# Altium footprint library 15-LEDs+LCD.PcbLib: 116 footprints (part 5 of 8) (continued)
## LED_DIALIGHT_570-0100-222F [mm] "3x Green LED 2mm PCB Edge Mounting DIALIGHT 570 Serie" (continued)
  text "A" at 3.96,-1.79 h1
  text "C" at 3.96,0.705 h1
  text "1" at -4.243,-1.53 h1
  text "2" at -4.458,0.79 h1
3D body "LED_DIALIGHT_570-0100-222F.stp": height 10.41, standoff -3.2, extent -11.12,-2.485 3.5,2.917

## LED_DIALIGHT_570-0100-223F [mm] "3x 2mm LED (Top: Green , Middle: Green, Bot: Yellow) PCB Edge Mounting DIALIGHT 570 Serie"
height 10.41
pads (6):
  round 1.7 hole 1: 1(-2.54,-1.27) 2(-2.54,1.27) 3(0,-1.27) 4(0,1.27) 5(2.54,-1.27) 6(2.54,1.27)
Top Overlay:
  lines w0.2: -9.59,-0.9 -10.22,-0.9 cw(c-10.22,0) -10.22,0.9 -9.59,0.9 ; -9.39,-1.651 -9.59,-1.651 -9.59,1.651 -9.39,1.651 ; -9.39,2.485 -9.39,-2.485 -3.086,-2.485 -3.086,-2.167 ; -3.086,2.493 -9.39,2.493 3.5,2.493 ; -3.048,2.493 -3.048,2.789 ; -2.032,2.493 -2.032,2.789 ; -1.994,-2.167 -1.994,-2.485 3.5,-2.485 3.5,-1.903 ; -1.994,2.493 3.5,2.493 ; 3.5,-0.637 3.5,0.637 ; 3.5,1.903 3.5,2.493
  text "A" at 3.96,-1.79 h1
  text "C" at 3.96,0.705 h1
  text "1" at -4.243,-1.53 h1
  text "2" at -4.458,0.79 h1
Mechanical 8:
  lines w0.1: -3.04,-1.27 -2.54,-1.27 ; -3.04,-1.27 -2.54,-1.27 ; -3.04,-1.27 -2.54,-1.27 ; -3.04,1.27 -2.54,1.27 ; -3.04,1.27 -2.54,1.27 ; -3.04,1.27 -2.54,1.27 ; -2.54,-1.77 -2.54,-1.27 ; -2.54,-1.77 -2.54,-1.27 ; -2.54,-1.77 -2.54,-1.27 ; -2.54,-1.27 -2.54,-0.77 ; -2.54,-1.27 -2.04,-1.27 ; -2.54,-1.27 -2.54,-0.77 ; -2.54,-1.27 -2.04,-1.27 ; -2.54,-1.27 -2.54,-0.77 ; -2.54,-1.27 -2.04,-1.27 ; -2.54,0.77 -2.54,1.27 ; -2.54,0.77 -2.54,1.27 ; -2.54,0.77 -2.54,1.27 ; -2.54,1.27 -2.54,1.77 ; -2.54,1.27 -2.04,1.27 ; -2.54,1.27 -2.54,1.77 ; -2.54,1.27 -2.04,1.27 ; -2.54,1.27 -2.54,1.77 ; -2.54,1.27 -2.04,1.27 ; -0.5,-1.27 0,-1.27 ; -0.5,-1.27 0,-1.27 ; -0.5,-1.27 0,-1.27 ; -0.5,0 0,0 ; -0.5,0 0,0 ; -0.5,0 0,0 ; -0.5,1.27 0,1.27 ; -0.5,1.27 0,1.27 ; -0.5,1.27 0,1.27 ; 0,-1.77 0,-1.27 ; 0,-1.77 0,-1.27 ; 0,-1.77 0,-1.27 ; 0,-1.27 0,-0.77 ; 0,-1.27 0.5,-1.27 ; 0,-1.27 0,-0.77 ; 0,-1.27 0.5,-1.27 ; 0,-1.27 0,-0.77 ; 0,-1.27 0.5,-1.27 ; 0,-0.5 0,0 ; 0,-0.5 0,0 ; 0,-0.5 0,0 ; 0,0 0,0.5 ; 0,0 0.5,0 ; 0,0 0,0.5 ; 0,0 0.5,0 ; 0,0 0,0.5 ; 0,0 0.5,0 ; 0,0.77 0,1.27 ; 0,0.77 0,1.27 ; 0,0.77 0,1.27 ; 0,1.27 0,1.77 ; 0,1.27 0.5,1.27 ; 0,1.27 0,1.77 ; 0,1.27 0.5,1.27 ; 0,1.27 0,1.77 ; 0,1.27 0.5,1.27 ; 2.04,-1.27 2.54,-1.27 ; 2.04,-1.27 2.54,-1.27 ; 2.04,-1.27 2.54,-1.27 ; 2.04,1.27 2.54,1.27 ; 2.04,1.27 2.54,1.27 ; 2.04,1.27 2.54,1.27 ; 2.54,-1.77 2.54,-1.27 ; 2.54,-1.77 2.54,-1.27 ; 2.54,-1.77 2.54,-1.27 ; 2.54,-1.27 2.54,-0.77 ; 2.54,-1.27 3.04,-1.27 ; 2.54,-1.27 2.54,-0.77 ; 2.54,-1.27 3.04,-1.27 ; 2.54,-1.27 2.54,-0.77 ; 2.54,-1.27 3.04,-1.27 ; 2.54,0.77 2.54,1.27 ; 2.54,0.77 2.54,1.27 ; 2.54,0.77 2.54,1.27 ; 2.54,1.27 2.54,1.77 ; 2.54,1.27 3.04,1.27 ; 2.54,1.27 2.54,1.77 ; 2.54,1.27 3.04,1.27 ; 2.54,1.27 2.54,1.77 ; 2.54,1.27 3.04,1.27
Mechanical 14:
  lines w0.1: -3.048,2.485 -3.048,2.917 ; -2.032,2.485 -2.032,2.917 ; -10.22,-0.9 cw(c-10.22,0) -10.22,0.9 ; -10.22,-0.9 cw(c-10.22,0) -10.22,0.9 ; -10.22,-0.9 cw(c-10.22,0) -10.22,0.9 ; -10.22,-0.9 -9.59,-0.9 ; -10.22,-0.9 -9.59,-0.9 ; -10.22,-0.9 -9.59,-0.9 ; -10.22,0.9 -9.59,0.9 ; -10.22,0.9 -9.59,0.9 ; -10.22,0.9 -9.59,0.9 ; -9.59,-1.651 -9.59,1.651 ; -9.59,-1.651 -9.39,-1.651 ; -9.59,-1.651 -9.59,1.651 ; -9.59,-1.651 -9.39,-1.651 ; -9.59,-1.651 -9.59,1.651 ; -9.59,-1.651 -9.39,-1.651 ; -9.59,1.651 -9.39,1.651 ; -9.59,1.651 -9.39,1.651 ; -9.59,1.651 -9.39,1.651 ; -9.39,-2.485 -9.39,2.485 ; -9.39,-2.485 -3.086,-2.485 ; -9.39,-2.485 -9.39,2.485 ; -9.39,-2.485 -3.086,-2.485 ; -9.39,-2.485 -9.39,2.485 ; -9.39,-2.485 -3.086,-2.485 ; -9.39,2.493 -3.048,2.493 ; -9.39,2.493 -3.048,2.493 ; -9.39,2.493 3.5,2.493 ; -3.086,-2.485 -3.086,-1.977 ; -3.086,-2.485 -3.086,-1.977 ; -3.086,-2.485 -3.086,-1.977 ; -3.086,-1.977 -1.994,-1.977 ; -3.086,-1.977 -1.994,-1.977 ; -3.086,-1.977 -1.994,-1.977 ; -3.048,2.493 -3.048,2.917 ; -3.048,2.493 -3.048,2.917 ; -3.048,2.917 -2.032,2.917 ; -3.048,2.917 -2.032,2.917 ; -3.048,2.917 -2.032,2.917 ; -2.032,2.493 -2.032,2.917 ; -2.032,2.493 3.5,2.493 ; -2.032,2.493 -2.032,2.917 ; -1.994,-2.485 -1.994,-1.977 ; -1.994,-2.485 3.5,-2.485 ; -1.994,-2.485 -1.994,-1.977 ; -1.994,-2.485 3.5,-2.485 ; -1.994,-2.485 -1.994,-1.977 ; -1.994,-2.485 3.5,-2.485 ; 3.5,-2.485 3.5,2.493 ; 3.5,-2.485 3.5,2.493 ; 3.5,-2.485 3.5,2.493
  text "A" at 3.96,-1.79 h1
  text "C" at 3.96,0.705 h1
  text "1" at -4.243,-1.53 h1
  text "2" at -4.458,0.79 h1
3D body "LED_DIALIGHT_570-0100-223F.stp": height 10.41, standoff -3.2, extent -11.12,-2.485 3.5,2.917

## LED_DIALIGHT_570-0100-330F [mm] "3x 2mm LED (Top: Green , Middle: Green, Bot: Blank) PCB Edge Mounting DIALIGHT 570 Serie"
height 10.41
pads (6):
  round 1.7 hole 1: 1(-2.54,-1.27) 2(-2.54,1.27) 3(0,-1.27) 4(0,1.27) 5(2.54,-1.27) 6(2.54,1.27)
Top Overlay:
  lines w0.2: -9.59,-0.9 -10.22,-0.9 cw(c-10.22,0) -10.22,0.9 -9.59,0.9 ; -9.39,-1.651 -9.59,-1.651 -9.59,1.651 -9.39,1.651 ; -9.39,2.485 -9.39,-2.485 -3.086,-2.485 -3.086,-2.167 ; -3.086,2.493 -9.39,2.493 3.5,2.493 ; -3.048,2.493 -3.048,2.789 ; -2.032,2.493 -2.032,2.789 ; -1.994,-2.167 -1.994,-2.485 3.5,-2.485 3.5,-1.903 ; -1.994,2.493 3.5,2.493 ; 3.5,-0.637 3.5,0.637 ; 3.5,1.903 3.5,2.493
  text "A" at 3.96,-1.79 h1
  text "C" at 3.96,0.705 h1
  text "1" at -4.243,-1.53 h1
  text "2" at -4.458,0.79 h1
Mechanical 8:
  lines w0.1: -3.04,-1.27 -2.54,-1.27 ; -3.04,-1.27 -2.54,-1.27 ; -3.04,-1.27 -2.54,-1.27 ; -3.04,1.27 -2.54,1.27 ; -3.04,1.27 -2.54,1.27 ; -3.04,1.27 -2.54,1.27 ; -2.54,-1.77 -2.54,-1.27 ; -2.54,-1.77 -2.54,-1.27 ; -2.54,-1.77 -2.54,-1.27 ; -2.54,-1.27 -2.54,-0.77 ; -2.54,-1.27 -2.04,-1.27 ; -2.54,-1.27 -2.54,-0.77 ; -2.54,-1.27 -2.04,-1.27 ; -2.54,-1.27 -2.54,-0.77 ; -2.54,-1.27 -2.04,-1.27 ; -2.54,0.77 -2.54,1.27 ; -2.54,0.77 -2.54,1.27 ; -2.54,0.77 -2.54,1.27 ; -2.54,1.27 -2.54,1.77 ; -2.54,1.27 -2.04,1.27 ; -2.54,1.27 -2.54,1.77 ; -2.54,1.27 -2.04,1.27 ; -2.54,1.27 -2.54,1.77 ; -2.54,1.27 -2.04,1.27 ; -0.5,-1.27 0,-1.27 ; -0.5,-1.27 0,-1.27 ; -0.5,-1.27 0,-1.27 ; -0.5,0 0,0 ; -0.5,0 0,0 ; -0.5,0 0,0 ; -0.5,1.27 0,1.27 ; -0.5,1.27 0,1.27 ; -0.5,1.27 0,1.27 ; 0,-1.77 0,-1.27 ; 0,-1.77 0,-1.27 ; 0,-1.77 0,-1.27 ; 0,-1.27 0,-0.77 ; 0,-1.27 0.5,-1.27 ; 0,-1.27 0,-0.77 ; 0,-1.27 0.5,-1.27 ; 0,-1.27 0,-0.77 ; 0,-1.27 0.5,-1.27 ; 0,-0.5 0,0 ; 0,-0.5 0,0 ; 0,-0.5 0,0 ; 0,0 0,0.5 ; 0,0 0.5,0 ; 0,0 0,0.5 ; 0,0 0.5,0 ; 0,0 0,0.5 ; 0,0 0.5,0 ; 0,0.77 0,1.27 ; 0,0.77 0,1.27 ; 0,0.77 0,1.27 ; 0,1.27 0,1.77 ; 0,1.27 0.5,1.27 ; 0,1.27 0,1.77 ; 0,1.27 0.5,1.27 ; 0,1.27 0,1.77 ; 0,1.27 0.5,1.27 ; 2.04,-1.27 2.54,-1.27 ; 2.04,-1.27 2.54,-1.27 ; 2.04,-1.27 2.54,-1.27 ; 2.04,1.27 2.54,1.27 ; 2.04,1.27 2.54,1.27 ; 2.04,1.27 2.54,1.27 ; 2.54,-1.77 2.54,-1.27 ; 2.54,-1.77 2.54,-1.27 ; 2.54,-1.77 2.54,-1.27 ; 2.54,-1.27 2.54,-0.77 ; 2.54,-1.27 3.04,-1.27 ; 2.54,-1.27 2.54,-0.77 ; 2.54,-1.27 3.04,-1.27 ; 2.54,-1.27 2.54,-0.77 ; 2.54,-1.27 3.04,-1.27 ; 2.54,0.77 2.54,1.27 ; 2.54,0.77 2.54,1.27 ; 2.54,0.77 2.54,1.27 ; 2.54,1.27 2.54,1.77 ; 2.54,1.27 3.04,1.27 ; 2.54,1.27 2.54,1.77 ; 2.54,1.27 3.04,1.27 ; 2.54,1.27 2.54,1.77 ; 2.54,1.27 3.04,1.27
Mechanical 14:
  lines w0.1: -3.048,2.485 -3.048,2.917 ; -2.032,2.485 -2.032,2.917 ; -10.22,-0.9 cw(c-10.22,0) -10.22,0.9 ; -10.22,-0.9 cw(c-10.22,0) -10.22,0.9 ; -10.22,-0.9 cw(c-10.22,0) -10.22,0.9 ; -10.22,-0.9 -9.59,-0.9 ; -10.22,-0.9 -9.59,-0.9 ; -10.22,-0.9 -9.59,-0.9 ; -10.22,0.9 -9.59,0.9 ; -10.22,0.9 -9.59,0.9 ; -10.22,0.9 -9.59,0.9 ; -9.59,-1.651 -9.59,1.651 ; -9.59,-1.651 -9.39,-1.651 ; -9.59,-1.651 -9.59,1.651 ; -9.59,-1.651 -9.39,-1.651 ; -9.59,-1.651 -9.59,1.651 ; -9.59,-1.651 -9.39,-1.651 ; -9.59,1.651 -9.39,1.651 ; -9.59,1.651 -9.39,1.651 ; -9.59,1.651 -9.39,1.651 ; -9.39,-2.485 -9.39,2.485 ; -9.39,-2.485 -3.086,-2.485 ; -9.39,-2.485 -9.39,2.485 ; -9.39,-2.485 -3.086,-2.485 ; -9.39,-2.485 -9.39,2.485 ; -9.39,-2.485 -3.086,-2.485 ; -9.39,2.493 -3.048,2.493 ; -9.39,2.493 -3.048,2.493 ; -9.39,2.493 3.5,2.493 ; -3.086,-2.485 -3.086,-1.977 ; -3.086,-2.485 -3.086,-1.977 ; -3.086,-2.485 -3.086,-1.977 ; -3.086,-1.977 -1.994,-1.977 ; -3.086,-1.977 -1.994,-1.977 ; -3.086,-1.977 -1.994,-1.977 ; -3.048,2.493 -3.048,2.917 ; -3.048,2.493 -3.048,2.917 ; -3.048,2.917 -2.032,2.917 ; -3.048,2.917 -2.032,2.917 ; -3.048,2.917 -2.032,2.917 ; -2.032,2.493 -2.032,2.917 ; -2.032,2.493 3.5,2.493 ; -2.032,2.493 -2.032,2.917 ; -1.994,-2.485 -1.994,-1.977 ; -1.994,-2.485 3.5,-2.485 ; -1.994,-2.485 -1.994,-1.977 ; -1.994,-2.485 3.5,-2.485 ; -1.994,-2.485 -1.994,-1.977 ; -1.994,-2.485 3.5,-2.485 ; 3.5,-2.485 3.5,2.493 ; 3.5,-2.485 3.5,2.493 ; 3.5,-2.485 3.5,2.493
  text "A" at 3.96,-1.79 h1
  text "C" at 3.96,0.705 h1
  text "1" at -4.243,-1.53 h1
  text "2" at -4.458,0.79 h1
3D body "LED_DIALIGHT_570-0100-330F.stp": height 10.41, standoff -3.2, extent -11.12,-2.485 3.5,2.917

## LED_DIALIGHT_570-0100-333F [mm] "3x Yellow LED 2mm PCB Edge Mounting DIALIGHT 570 Serie"
height 10.41
pads (6):
  round 1.7 hole 1: 1(-2.54,-1.27) 2(-2.54,1.27) 3(0,-1.27) 4(0,1.27) 5(2.54,-1.27) 6(2.54,1.27)
Top Overlay:
  lines w0.2: -9.59,-0.9 -10.22,-0.9 cw(c-10.22,0) -10.22,0.9 -9.59,0.9 ; -9.39,-1.651 -9.59,-1.651 -9.59,1.651 -9.39,1.651 ; -9.39,2.485 -9.39,-2.485 -3.086,-2.485 -3.086,-2.167 ; -3.086,2.493 -9.39,2.493 3.5,2.493 ; -3.048,2.493 -3.048,2.789 ; -2.032,2.493 -2.032,2.789 ; -1.994,-2.167 -1.994,-2.485 3.5,-2.485 3.5,-1.903 ; -1.994,2.493 3.5,2.493 ; 3.5,-0.637 3.5,0.637 ; 3.5,1.903 3.5,2.493
  text "2" at -4.458,0.79 h1
  text "1" at -4.243,-1.53 h1
  text "C" at 3.96,0.705 h1
  text "A" at 3.96,-1.79 h1
Mechanical 8:
  lines w0.1: -3.04,-1.27 -2.54,-1.27 ; -3.04,-1.27 -2.54,-1.27 ; -3.04,-1.27 -2.54,-1.27 ; -3.04,1.27 -2.54,1.27 ; -3.04,1.27 -2.54,1.27 ; -3.04,1.27 -2.54,1.27 ; -2.54,-1.77 -2.54,-1.27 ; -2.54,-1.77 -2.54,-1.27 ; -2.54,-1.77 -2.54,-1.27 ; -2.54,-1.27 -2.04,-1.27 ; -2.54,-1.27 -2.54,-0.77 ; -2.54,-1.27 -2.04,-1.27 ; -2.54,-1.27 -2.54,-0.77 ; -2.54,-1.27 -2.04,-1.27 ; -2.54,-1.27 -2.54,-0.77 ; -2.54,0.77 -2.54,1.27 ; -2.54,0.77 -2.54,1.27 ; -2.54,0.77 -2.54,1.27 ; -2.54,1.27 -2.04,1.27 ; -2.54,1.27 -2.54,1.77 ; -2.54,1.27 -2.04,1.27 ; -2.54,1.27 -2.54,1.77 ; -2.54,1.27 -2.04,1.27 ; -2.54,1.27 -2.54,1.77 ; -0.5,-1.27 0,-1.27 ; -0.5,-1.27 0,-1.27 ; -0.5,-1.27 0,-1.27 ; -0.5,0 0,0 ; -0.5,0 0,0 ; -0.5,0 0,0 ; -0.5,1.27 0,1.27 ; -0.5,1.27 0,1.27 ; -0.5,1.27 0,1.27 ; 0,-1.77 0,-1.27 ; 0,-1.77 0,-1.27 ; 0,-1.77 0,-1.27 ; 0,-1.27 0.5,-1.27 ; 0,-1.27 0,-0.77 ; 0,-1.27 0.5,-1.27 ; 0,-1.27 0,-0.77 ; 0,-1.27 0.5,-1.27 ; 0,-1.27 0,-0.77 ; 0,-0.5 0,0 ; 0,-0.5 0,0 ; 0,-0.5 0,0 ; 0,0 0.5,0 ; 0,0 0,0.5 ; 0,0 0.5,0 ; 0,0 0,0.5 ; 0,0 0.5,0 ; 0,0 0,0.5 ; 0,0.77 0,1.27 ; 0,0.77 0,1.27 ; 0,0.77 0,1.27 ; 0,1.27 0.5,1.27 ; 0,1.27 0,1.77 ; 0,1.27 0.5,1.27 ; 0,1.27 0,1.77 ; 0,1.27 0.5,1.27 ; 0,1.27 0,1.77 ; 2.04,-1.27 2.54,-1.27 ; 2.04,-1.27 2.54,-1.27 ; 2.04,-1.27 2.54,-1.27 ; 2.04,1.27 2.54,1.27 ; 2.04,1.27 2.54,1.27 ; 2.04,1.27 2.54,1.27 ; 2.54,-1.77 2.54,-1.27 ; 2.54,-1.77 2.54,-1.27 ; 2.54,-1.77 2.54,-1.27 ; 2.54,-1.27 3.04,-1.27 ; 2.54,-1.27 2.54,-0.77 ; 2.54,-1.27 3.04,-1.27 ; 2.54,-1.27 2.54,-0.77 ; 2.54,-1.27 3.04,-1.27 ; 2.54,-1.27 2.54,-0.77 ; 2.54,0.77 2.54,1.27 ; 2.54,0.77 2.54,1.27 ; 2.54,0.77 2.54,1.27 ; 2.54,1.27 3.04,1.27 ; 2.54,1.27 2.54,1.77 ; 2.54,1.27 3.04,1.27 ; 2.54,1.27 2.54,1.77 ; 2.54,1.27 3.04,1.27 ; 2.54,1.27 2.54,1.77
Mechanical 14:
  lines w0.1: -3.048,2.485 -3.048,2.917 ; -2.032,2.485 -2.032,2.917 ; -10.22,-0.9 cw(c-10.22,0) -10.22,0.9 ; -10.22,-0.9 cw(c-10.22,0) -10.22,0.9 ; -10.22,-0.9 cw(c-10.22,0) -10.22,0.9 ; -10.22,-0.9 -9.59,-0.9 ; -10.22,-0.9 -9.59,-0.9 ; -10.22,-0.9 -9.59,-0.9 ; -10.22,0.9 -9.59,0.9 ; -10.22,0.9 -9.59,0.9 ; -10.22,0.9 -9.59,0.9 ; -9.59,-1.651 -9.39,-1.651 ; -9.59,-1.651 -9.59,1.651 ; -9.59,-1.651 -9.39,-1.651 ; -9.59,-1.651 -9.59,1.651 ; -9.59,-1.651 -9.39,-1.651 ; -9.59,-1.651 -9.59,1.651 ; -9.59,1.651 -9.39,1.651 ; -9.59,1.651 -9.39,1.651 ; -9.59,1.651 -9.39,1.651 ; -9.39,-2.485 -3.086,-2.485 ; -9.39,-2.485 -9.39,2.485 ; -9.39,-2.485 -3.086,-2.485 ; -9.39,-2.485 -9.39,2.485 ; -9.39,-2.485 -3.086,-2.485 ; -9.39,-2.485 -9.39,2.485 ; -9.39,2.493 3.5,2.493 ; -9.39,2.493 -3.048,2.493 ; -9.39,2.493 -3.048,2.493 ; -3.086,-2.485 -3.086,-1.977 ; -3.086,-2.485 -3.086,-1.977 ; -3.086,-2.485 -3.086,-1.977 ; -3.086,-1.977 -1.994,-1.977 ; -3.086,-1.977 -1.994,-1.977 ; -3.086,-1.977 -1.994,-1.977 ; -3.048,2.493 -3.048,2.917 ; -3.048,2.493 -3.048,2.917 ; -3.048,2.917 -2.032,2.917 ; -3.048,2.917 -2.032,2.917 ; -3.048,2.917 -2.032,2.917 ; -2.032,2.493 -2.032,2.917 ; -2.032,2.493 3.5,2.493 ; -2.032,2.493 -2.032,2.917 ; -1.994,-2.485 3.5,-2.485 ; -1.994,-2.485 -1.994,-1.977 ; -1.994,-2.485 3.5,-2.485 ; -1.994,-2.485 -1.994,-1.977 ; -1.994,-2.485 3.5,-2.485 ; -1.994,-2.485 -1.994,-1.977 ; 3.5,-2.485 3.5,2.493 ; 3.5,-2.485 3.5,2.493 ; 3.5,-2.485 3.5,2.493
  text "2" at -4.458,0.79 h1
  text "1" at -4.243,-1.53 h1
  text "C" at 3.96,0.705 h1
  text "A" at 3.96,-1.79 h1
3D body "LED_DIALIGHT_570-0100-333F.stp": height 10.41, standoff -3.2, extent -11.12,-2.485 3.5,2.917

## LED_DIALIGHT_571-0111-100F [mm] "2x 2mm LED (Top: Red, Bot: Red) PCB Edge Mounting (With positioning pins) DIALIGHT 571 Serie"
height 8.6
pads (4):
  round 1.7 hole 1: 1(0,0) 2(2.54,0) 3(5.08,0) 4(7.62,0)
Top Overlay:
  lines w0.2: -4.83,-1 -5.35,-1 cw(c-5.35,0) -5.35,1 -4.83,1 ; -4.445,0 -4.064,0 ; -4.064,-0.508 -4.064,0.508 ; -3.556,0 -3.175,0 ; -3.46,-1.25 -4.83,-1.25 ; -3.46,1.25 -4.83,1.25 ; -2.794,0 -2.413,0 ; -2.413,-0.508 -2.413,0.508 ; -1.905,0 -1.524,0 ; -1.67,-1.8 -1.67,-1.25 ; -0.87,-1.8 -0.87,-1.25 ; 3.41,-1.8 3.41,-1.25 ; 4.21,-1.8 4.21,-1.25 ; -4.83,-1.25 -4.83,1.25 ; -4.83,-1.25 8.89,-1.25 8.89,1.25 -4.83,1.25 ; -4.064,0 -3.556,0.508 -3.556,-0.508 -4.064,0 ; -2.413,0 -1.905,0.508 -1.905,-0.508 -2.413,0 ; -1.37,-2.52 -1.17,-2.52 -1.37,-2.52 ; 3.71,-2.52 3.91,-2.52 3.71,-2.52
Mechanical 8:
  lines w0.1: -1,0 0,0 ; 0,-1 0,0 ; 0,1 0,0 ; 1,0 0,0 ; 1.54,0 2.54,0 ; 2.54,-1 2.54,0 ; 2.54,1 2.54,0 ; 3.54,0 2.54,0 ; 4.08,0 5.08,0 ; 5.08,-1 5.08,0 ; 5.08,1 5.08,0 ; 6.08,0 5.08,0 ; 6.62,0 7.62,0 ; 7.62,-1 7.62,0 ; 7.62,1 7.62,0 ; 8.62,0 7.62,0
Mechanical 14:
  lines w0.1: -4.83,-1 -5.35,-1 cw(c-5.35,0) -5.35,1 -4.83,1 ; -4.445,0 -4.064,0 ; -3.556,0 -3.175,0 ; -3.46,-1.25 -4.83,-1.25 ; -3.46,1.25 -4.83,1.25 ; -2.794,0 -2.413,0 ; -1.905,0 -1.524,0 ; -1.67,-1.25 -1.67,-2.22 ccw(c-1.37,-2.22) -1.37,-2.52 -1.17,-2.52 ccw(c-1.17,-2.22) -0.87,-2.22 -0.87,-1.25 ; 3.41,-1.25 3.41,-2.22 ccw(c3.71,-2.22) 3.71,-2.52 3.91,-2.52 ccw(c3.91,-2.22) 4.21,-2.22 4.21,-1.25 ; -4.83,-1.25 -4.83,1.25 ; -4.83,-1.25 8.89,-1.25 8.89,1.25 -4.83,1.25 ; -4.064,-0.508 -4.064,0.508 ; -4.064,-0.508 -4.064,0.508 ; -4.064,-0.508 -4.064,0.508 ; -4.064,0 -3.556,-0.508 ; -4.064,0 -3.556,0.508 ; -4.064,0 -3.556,0.508 ; -4.064,0 -3.556,-0.508 ; -4.064,0 -3.556,-0.508 ; -4.064,0 -3.556,0.508 ; -3.556,-0.508 -3.556,0.508 ; -3.556,-0.508 -3.556,0.508 ; -3.556,-0.508 -3.556,0.508 ; -2.413,-0.508 -2.413,0.508 ; -2.413,-0.508 -2.413,0.508 ; -2.413,-0.508 -2.413,0.508 ; -2.413,0 -1.905,-0.508 ; -2.413,0 -1.905,0.508 ; -2.413,0 -1.905,0.508 ; -2.413,0 -1.905,-0.508 ; -2.413,0 -1.905,-0.508 ; -2.413,0 -1.905,0.508 ; -1.905,-0.508 -1.905,0.508 ; -1.905,-0.508 -1.905,0.508 ; -1.905,-0.508 -1.905,0.508
3D body "LED_DIALIGHT_571-0111-100F.stp": height 8.6, standoff -3, extent -6.35,-2.52 8.89,1.25

## LED_DIALIGHT_571-0111F [mm] "2x 2mm LED (Top: Red, Bot: Red) PCB Edge Mounting (Without positioning pins) DIALIGHT 571 Serie"
height 8.6
pads (4):
  round 1.7 hole 1: 1(0,0) 2(2.54,0) 3(5.08,0) 4(7.62,0)
Top Overlay:
  lines w0.2: -4.83,-1 -5.35,-1 cw(c-5.35,0) -5.35,1 -4.83,1 ; -4.445,0 -4.064,0 ; -4.064,-0.508 -4.064,0.508 ; -3.556,0 -3.175,0 ; -3.46,-1.25 -4.83,-1.25 ; -3.46,1.25 -4.83,1.25 ; -2.794,0 -2.413,0 ; -2.413,-0.508 -2.413,0.508 ; -1.905,0 -1.524,0 ; -4.83,-1.25 8.89,-1.25 8.89,1.25 -4.83,1.25 ; -4.83,-1.25 -4.83,1.25 ; -4.064,0 -3.556,-0.508 -3.556,0.508 -4.064,0 ; -2.413,0 -1.905,-0.508 -1.905,0.508 -2.413,0
Mechanical 8:
  lines w0.1: -1,0 0,0 ; 0,-1 0,0 ; 0,1 0,0 ; 1,0 0,0 ; 1.54,0 2.54,0 ; 2.54,-1 2.54,0 ; 2.54,1 2.54,0 ; 3.54,0 2.54,0 ; 4.08,0 5.08,0 ; 5.08,-1 5.08,0 ; 5.08,1 5.08,0 ; 6.08,0 5.08,0 ; 6.62,0 7.62,0 ; 7.62,-1 7.62,0 ; 7.62,1 7.62,0 ; 8.62,0 7.62,0
Mechanical 14:
  lines w0.1: -4.83,-1 -5.35,-1 cw(c-5.35,0) -5.35,1 -4.83,1 ; -4.445,0 -4.064,0 ; -3.556,0 -3.175,0 ; -3.46,-1.25 -4.83,-1.25 ; -3.46,1.25 -4.83,1.25 ; -2.794,0 -2.413,0 ; -1.905,0 -1.524,0 ; -4.83,-1.25 8.89,-1.25 8.89,1.25 -4.83,1.25 ; -4.83,-1.25 -4.83,1.25 ; -4.064,-0.508 -4.064,0.508 ; -4.064,-0.508 -4.064,0.508 ; -4.064,-0.508 -4.064,0.508 ; -4.064,0 -3.556,0.508 ; -4.064,0 -3.556,-0.508 ; -4.064,0 -3.556,-0.508 ; -4.064,0 -3.556,0.508 ; -4.064,0 -3.556,0.508 ; -4.064,0 -3.556,-0.508 ; -3.556,-0.508 -3.556,0.508 ; -3.556,-0.508 -3.556,0.508 ; -3.556,-0.508 -3.556,0.508 ; -2.413,-0.508 -2.413,0.508 ; -2.413,-0.508 -2.413,0.508 ; -2.413,-0.508 -2.413,0.508 ; -2.413,0 -1.905,0.508 ; -2.413,0 -1.905,-0.508 ; -2.413,0 -1.905,-0.508 ; -2.413,0 -1.905,0.508 ; -2.413,0 -1.905,0.508 ; -2.413,0 -1.905,-0.508 ; -1.905,-0.508 -1.905,0.508 ; -1.905,-0.508 -1.905,0.508 ; -1.905,-0.508 -1.905,0.508
3D body "LED_DIALIGHT_571-0111F.stp": height 8.6, standoff -3, extent -6.35,-1.25 8.89,1.25

## LED_DIALIGHT_571-0112F [mm] "2x 2mm LED (Top: Red, Bot: Green) PCB Edge Mounting (Without positioning pins) DIALIGHT 571 Serie"
height 8.6
pads (4):
  round 1.7 hole 1: 1(0,0) 2(2.54,0) 3(5.08,0) 4(7.62,0)
Top Overlay:
  lines w0.2: -4.83,-1 -5.35,-1 cw(c-5.35,0) -5.35,1 -4.83,1 ; -4.445,0 -4.064,0 ; -4.064,-0.508 -4.064,0.508 ; -3.556,0 -3.175,0 ; -3.46,-1.25 -4.83,-1.25 ; -3.46,1.25 -4.83,1.25 ; -2.794,0 -2.413,0 ; -2.413,-0.508 -2.413,0.508 ; -1.905,0 -1.524,0 ; -4.83,-1.25 -4.83,1.25 ; -4.83,-1.25 8.89,-1.25 8.89,1.25 -4.83,1.25 ; -4.064,0 -3.556,0.508 -3.556,-0.508 -4.064,0 ; -2.413,0 -1.905,0.508 -1.905,-0.508 -2.413,0
Mechanical 8:
  lines w0.1: -1,0 0,0 ; 0,-1 0,0 ; 0,1 0,0 ; 1,0 0,0 ; 1.54,0 2.54,0 ; 2.54,-1 2.54,0 ; 2.54,1 2.54,0 ; 3.54,0 2.54,0 ; 4.08,0 5.08,0 ; 5.08,-1 5.08,0 ; 5.08,1 5.08,0 ; 6.08,0 5.08,0 ; 6.62,0 7.62,0 ; 7.62,-1 7.62,0 ; 7.62,1 7.62,0 ; 8.62,0 7.62,0
Mechanical 14:
  lines w0.1: -4.83,-1 -5.35,-1 cw(c-5.35,0) -5.35,1 -4.83,1 ; -4.445,0 -4.064,0 ; -3.556,0 -3.175,0 ; -3.46,-1.25 -4.83,-1.25 ; -3.46,1.25 -4.83,1.25 ; -2.794,0 -2.413,0 ; -1.905,0 -1.524,0 ; -4.83,-1.25 -4.83,1.25 ; -4.83,-1.25 8.89,-1.25 8.89,1.25 -4.83,1.25 ; -4.064,-0.508 -4.064,0.508 ; -4.064,-0.508 -4.064,0.508 ; -4.064,-0.508 -4.064,0.508 ; -4.064,0 -3.556,-0.508 ; -4.064,0 -3.556,0.508 ; -4.064,0 -3.556,0.508 ; -4.064,0 -3.556,-0.508 ; -4.064,0 -3.556,-0.508 ; -4.064,0 -3.556,0.508 ; -3.556,-0.508 -3.556,0.508 ; -3.556,-0.508 -3.556,0.508 ; -3.556,-0.508 -3.556,0.508 ; -2.413,-0.508 -2.413,0.508 ; -2.413,-0.508 -2.413,0.508 ; -2.413,-0.508 -2.413,0.508 ; -2.413,0 -1.905,-0.508 ; -2.413,0 -1.905,0.508 ; -2.413,0 -1.905,0.508 ; -2.413,0 -1.905,-0.508 ; -2.413,0 -1.905,-0.508 ; -2.413,0 -1.905,0.508 ; -1.905,-0.508 -1.905,0.508 ; -1.905,-0.508 -1.905,0.508 ; -1.905,-0.508 -1.905,0.508
3D body "LED_DIALIGHT_571-0112F.stp": height 8.6, standoff -3, extent -6.35,-1.25 8.89,1.25

## LED_DIALIGHT_571-0122-100F [mm] "2x 2mm LED (Top: Green, Bot: Green) PCB Edge Mounting (With positioning pins) DIALIGHT 571 Serie"
height 8.6
pads (4):
  round 1.7 hole 1: 1(0,0) 2(2.54,0) 3(5.08,0) 4(7.62,0)
Top Overlay:
  lines w0.2: -4.83,-1 -5.35,-1 cw(c-5.35,0) -5.35,1 -4.83,1 ; -4.445,0 -4.064,0 ; -4.064,-0.508 -4.064,0.508 ; -3.556,0 -3.175,0 ; -3.46,-1.25 -4.83,-1.25 ; -3.46,1.25 -4.83,1.25 ; -2.794,0 -2.413,0 ; -2.413,-0.508 -2.413,0.508 ; -1.905,0 -1.524,0 ; -1.67,-1.8 -1.67,-1.25 ; -0.87,-1.8 -0.87,-1.25 ; 3.41,-1.8 3.41,-1.25 ; 4.21,-1.8 4.21,-1.25 ; -4.83,-1.25 -4.83,1.25 ; -4.83,-1.25 8.89,-1.25 8.89,1.25 -4.83,1.25 ; -4.064,0 -3.556,0.508 -3.556,-0.508 -4.064,0 ; -2.413,0 -1.905,0.508 -1.905,-0.508 -2.413,0 ; -1.37,-2.52 -1.17,-2.52 -1.37,-2.52 ; 3.71,-2.52 3.91,-2.52 3.71,-2.52
Mechanical 8:
  lines w0.1: -1,0 0,0 ; 0,-1 0,0 ; 0,1 0,0 ; 1,0 0,0 ; 1.54,0 2.54,0 ; 2.54,-1 2.54,0 ; 2.54,1 2.54,0 ; 3.54,0 2.54,0 ; 4.08,0 5.08,0 ; 5.08,-1 5.08,0 ; 5.08,1 5.08,0 ; 6.08,0 5.08,0 ; 6.62,0 7.62,0 ; 7.62,-1 7.62,0 ; 7.62,1 7.62,0 ; 8.62,0 7.62,0
Mechanical 14:
  lines w0.1: -4.83,-1 -5.35,-1 cw(c-5.35,0) -5.35,1 -4.83,1 ; -4.445,0 -4.064,0 ; -3.556,0 -3.175,0 ; -3.46,-1.25 -4.83,-1.25 ; -3.46,1.25 -4.83,1.25 ; -2.794,0 -2.413,0 ; -1.905,0 -1.524,0 ; -1.67,-1.25 -1.67,-2.22 ccw(c-1.37,-2.22) -1.37,-2.52 -1.17,-2.52 ccw(c-1.17,-2.22) -0.87,-2.22 -0.87,-1.25 ; 3.41,-1.25 3.41,-2.22 ccw(c3.71,-2.22) 3.71,-2.52 3.91,-2.52 ccw(c3.91,-2.22) 4.21,-2.22 4.21,-1.25 ; -4.83,-1.25 -4.83,1.25 ; -4.83,-1.25 8.89,-1.25 8.89,1.25 -4.83,1.25 ; -4.064,-0.508 -4.064,0.508 ; -4.064,-0.508 -4.064,0.508 ; -4.064,-0.508 -4.064,0.508 ; -4.064,0 -3.556,-0.508 ; -4.064,0 -3.556,0.508 ; -4.064,0 -3.556,0.508 ; -4.064,0 -3.556,-0.508 ; -4.064,0 -3.556,-0.508 ; -4.064,0 -3.556,0.508 ; -3.556,-0.508 -3.556,0.508 ; -3.556,-0.508 -3.556,0.508 ; -3.556,-0.508 -3.556,0.508 ; -2.413,-0.508 -2.413,0.508 ; -2.413,-0.508 -2.413,0.508 ; -2.413,-0.508 -2.413,0.508 ; -2.413,0 -1.905,-0.508 ; -2.413,0 -1.905,0.508 ; -2.413,0 -1.905,0.508 ; -2.413,0 -1.905,-0.508 ; -2.413,0 -1.905,-0.508 ; -2.413,0 -1.905,0.508 ; -1.905,-0.508 -1.905,0.508 ; -1.905,-0.508 -1.905,0.508 ; -1.905,-0.508 -1.905,0.508
3D body "LED_DIALIGHT_571-0122-100F.stp": height 8.6, standoff -3, extent -6.35,-2.52 8.89,1.25

## LED_DIALIGHT_571-0122F [mm] "2x 2mm LED (Top: Green, Bot: Green) PCB Edge Mounting (Without positioning pins) DIALIGHT 571 Serie"
height 8.6
pads (4):
  round 1.7 hole 1: 1(0,0) 2(2.54,0) 3(5.08,0) 4(7.62,0)
Top Overlay:
  lines w0.2: -4.83,-1 -5.35,-1 cw(c-5.35,0) -5.35,1 -4.83,1 ; -4.445,0 -4.064,0 ; -4.064,-0.508 -4.064,0.508 ; -3.556,0 -3.175,0 ; -3.46,-1.25 -4.83,-1.25 ; -3.46,1.25 -4.83,1.25 ; -2.794,0 -2.413,0 ; -2.413,-0.508 -2.413,0.508 ; -1.905,0 -1.524,0 ; -4.83,-1.25 8.89,-1.25 8.89,1.25 -4.83,1.25 ; -4.83,-1.25 -4.83,1.25 ; -4.064,0 -3.556,-0.508 -3.556,0.508 -4.064,0 ; -2.413,0 -1.905,-0.508 -1.905,0.508 -2.413,0
Mechanical 8:
  lines w0.1: -1,0 0,0 ; 0,-1 0,0 ; 0,1 0,0 ; 1,0 0,0 ; 1.54,0 2.54,0 ; 2.54,-1 2.54,0 ; 2.54,1 2.54,0 ; 3.54,0 2.54,0 ; 4.08,0 5.08,0 ; 5.08,-1 5.08,0 ; 5.08,1 5.08,0 ; 6.08,0 5.08,0 ; 6.62,0 7.62,0 ; 7.62,-1 7.62,0 ; 7.62,1 7.62,0 ; 8.62,0 7.62,0
Mechanical 14:
  lines w0.1: -4.83,-1 -5.35,-1 cw(c-5.35,0) -5.35,1 -4.83,1 ; -4.445,0 -4.064,0 ; -3.556,0 -3.175,0 ; -3.46,-1.25 -4.83,-1.25 ; -3.46,1.25 -4.83,1.25 ; -2.794,0 -2.413,0 ; -1.905,0 -1.524,0 ; -4.83,-1.25 8.89,-1.25 8.89,1.25 -4.83,1.25 ; -4.83,-1.25 -4.83,1.25 ; -4.064,-0.508 -4.064,0.508 ; -4.064,-0.508 -4.064,0.508 ; -4.064,-0.508 -4.064,0.508 ; -4.064,0 -3.556,0.508 ; -4.064,0 -3.556,-0.508 ; -4.064,0 -3.556,-0.508 ; -4.064,0 -3.556,0.508 ; -4.064,0 -3.556,0.508 ; -4.064,0 -3.556,-0.508 ; -3.556,-0.508 -3.556,0.508 ; -3.556,-0.508 -3.556,0.508 ; -3.556,-0.508 -3.556,0.508 ; -2.413,-0.508 -2.413,0.508 ; -2.413,-0.508 -2.413,0.508 ; -2.413,-0.508 -2.413,0.508 ; -2.413,0 -1.905,0.508 ; -2.413,0 -1.905,-0.508 ; -2.413,0 -1.905,-0.508 ; -2.413,0 -1.905,0.508 ; -2.413,0 -1.905,0.508 ; -2.413,0 -1.905,-0.508 ; -1.905,-0.508 -1.905,0.508 ; -1.905,-0.508 -1.905,0.508 ; -1.905,-0.508 -1.905,0.508
3D body "LED_DIALIGHT_571-0122F.stp": height 8.6, standoff -3, extent -6.35,-1.25 8.89,1.25